# Altium footprint library 二极管封装库.PcbLib: 222 footprints (part 3 of 14)
Each footprint in its own frame and in the unit in brackets; x right, y up, seen from the top. Pads: shape width x height; smd on the part's side, far side on the other; paste and mask are expansions set on the pad; w line width, h text height; cw(c..) or ccw(c..) is an arc to the next point about the centre after c.
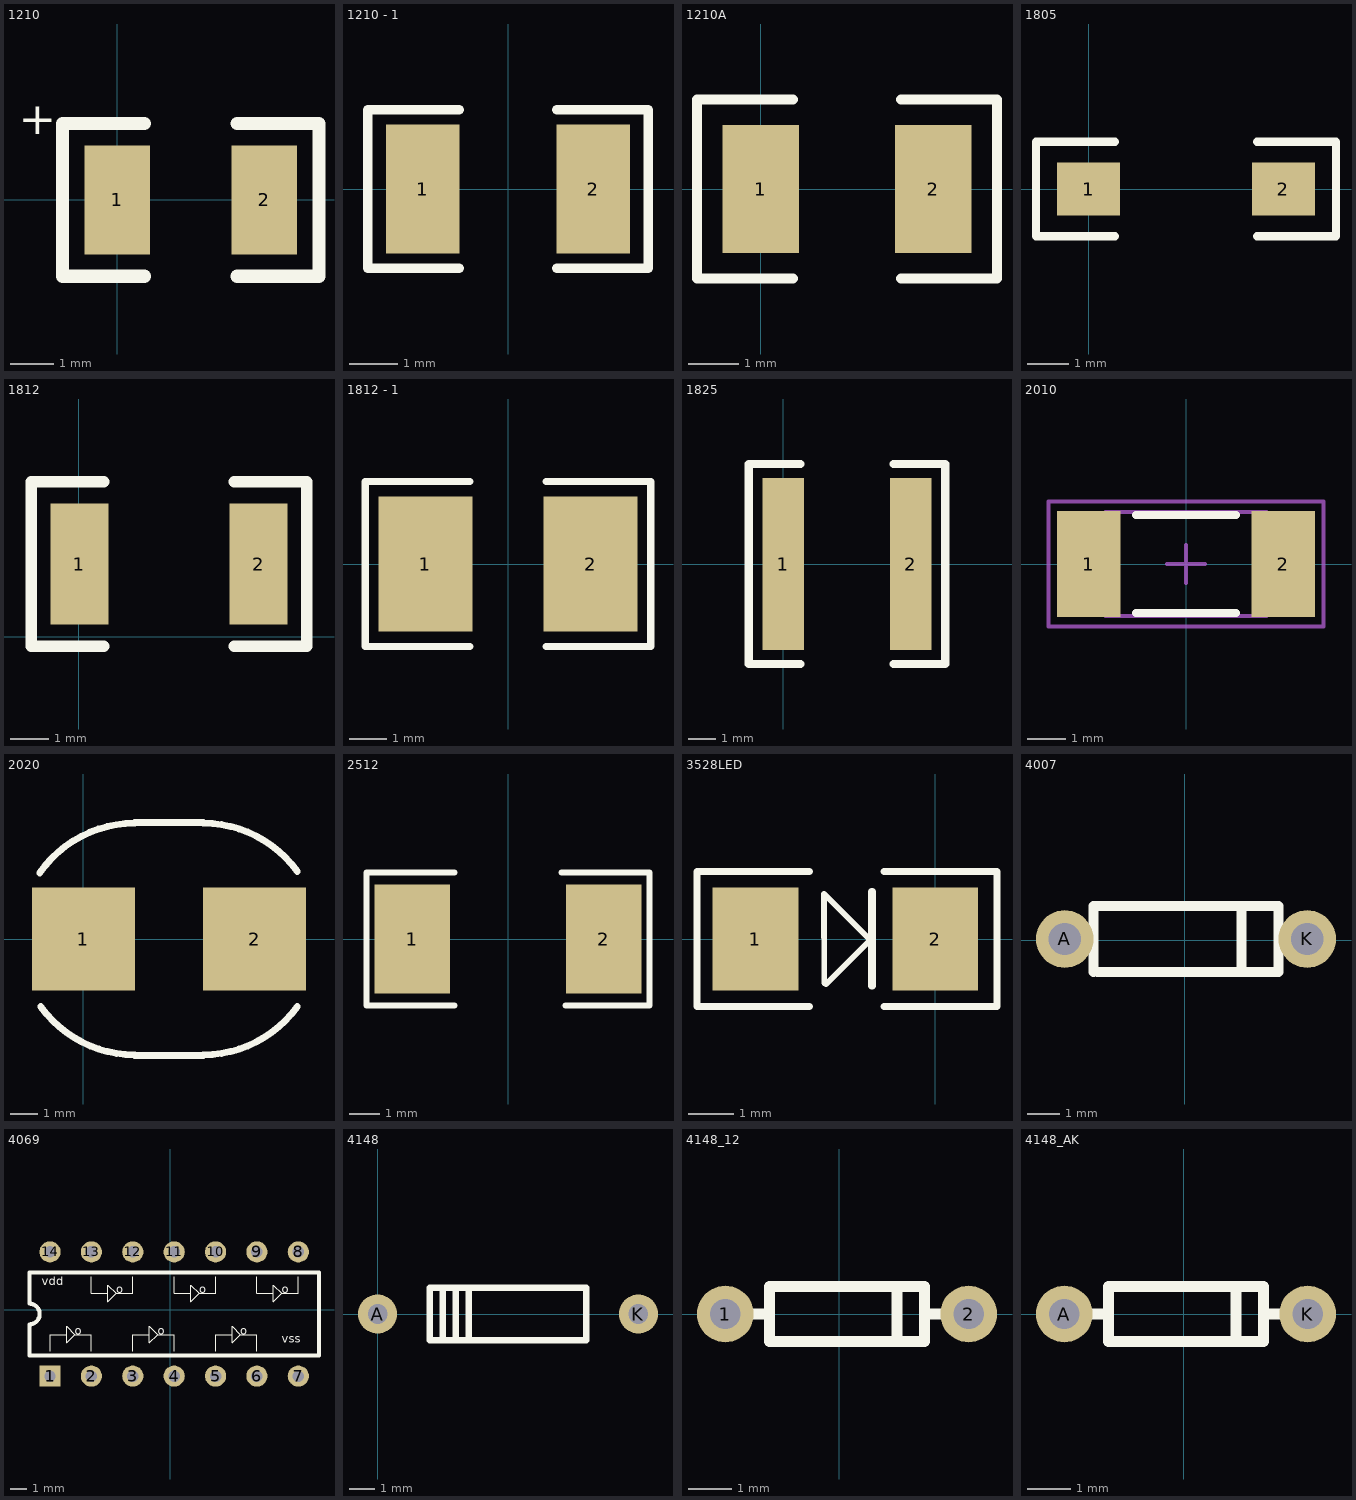
[diagram p2: the footprints below, top view; thin cyan lines are the x and y axes]

## 1210 [mil]
pads (2):
  rect 60x100 smd: 1(0,0) 2(135,0)
Top Overlay:
  lines w12: 25,-70 -50,-70 -50,70 25,70 ; 110,-70 185,-70 185,70 110,70
  text "+" at -90,60 h30

## 1210 - 1 [mil] "贴片元件"
height 59.06
pads (2):
  rect 60x106.3 smd: 1(-70,0) 2(70,0)
Top Overlay:
  lines w7.87: -40,-65 -115,-65 -115,65 -40,65 ; 40,-65 115,-65 115,65 40,65
3D body: height 39.37, standoff 0, extent -65,-50 65,50

## 1210A [mil]
pads (2):
  rect 60x100 smd: 1(0,0) 2(135,0)
Top Overlay:
  lines w7.87: 25,-70 -50,-70 -50,70 25,70 ; 110,-70 185,-70 185,70 110,70

## 1805 [mil]
pads (2):
  rect 60x50 smd: 1(0,0) 2(185,0)
Top Overlay:
  lines w7.87: 25,-45 -50,-45 -50,45 25,45 ; 160,-45 235,-45 235,45 160,45

## 1812 [mil]
pads (2):
  rect 60x125 smd: 1(1,75) 2(186,75)
Top Overlay:
  lines w12: 26,-10 -49,-10 -49,160 26,160 ; 161,-10 236,-10 236,160 161,160

## 1812 - 1 [mm] "保险丝"
height 1
pads (2):
  rect 2.5x3.6 smd: 1(-2.2,0) 2(2.2,0)
Top Overlay:
  lines w0.2: -1.016,-2.2 -3.81,-2.2 -3.81,2.2 -1.016,2.2 ; 1.016,-2.2 3.81,-2.2 3.81,2.2 1.016,2.2
3D body: height 0.9, standoff 0, extent -2.54,0.635 -2.032,1.524
3D body: height 0.9, standoff 0, extent -2.54,-1.524 -2.032,-0.635
3D body: height 0.9, standoff 0, extent 2.159,-1.524 2.667,-0.635
3D body: height 0.9, standoff 0, extent 2.159,0.635 2.667,1.524
3D body: height 1.2, standoff 0, extent -2.286,-1.651 2.286,1.651

## 1825 [mil]
pads (2):
  rect 60x250 smd: 1(0,0) 2(185,0)
Top Overlay:
  lines w12: 25,-145 -50,-145 -50,145 25,145 ; 160,-145 235,-145 235,145 160,145

## 2010 [mm] "贴片电阻"
height 0.6
pads (2):
  rect 1.65x2.75 smd: 1(-2.525,0) 2(2.525,0)
Top Overlay:
  lines w0.2: -1.3,-1.275 1.3,-1.275 ; -1.3,1.275 1.3,1.275
Mechanical 13:
  lines w0.1: -2.1,-1.35 2.1,-1.35 2.1,1.35 -2.1,1.35 -2.1,-1.35
Mechanical 15:
  lines w0.1: -0.5,0 0.5,0 ; 0,-0.5 0,0.5 ; -3.575,-1.625 3.575,-1.625 3.575,1.625 -3.575,1.625 -3.575,-1.625
3D body: height 0.6, standoff 0, extent -2.1,-1.35 2.1,1.35

## 2020 [mil]
pads (2):
  rect 150x150 smd: 1(0,0) 2(250,0)
Top Overlay:
  lines w10: -63.89,96.62 cw(c75,0) 75,169.19 ; -62.3,-98.86 ccw(c75,0) 75,-169.19 ; 75,-170 175,-170 ; 75,170 175,170 ; 175,-169.19 ccw(c175,0) 312.3,-98.86 ; 175,169.19 cw(c175,0) 312.3,98.86

## 2512 [mm] "保险丝"
height 1
pads (2):
  rect 2.5x3.6 smd: 1(-3.175,0) 2(3.175,0)
Top Overlay:
  lines w0.2: -1.778,-2.2 -4.699,-2.2 -4.699,2.2 -1.778,2.2 ; 1.778,2.2 4.699,2.2 4.699,-2.2 1.905,-2.2
3D body: height 1.2, standoff 0, extent -3.175,-1.651 3.175,1.651
3D body: height 0.9, standoff 0, extent 2.159,0.635 2.667,1.524
3D body: height 0.9, standoff 0, extent 2.159,-1.524 2.667,-0.635
3D body: height 0.9, standoff 0, extent -2.54,-1.524 -2.032,-0.635
3D body: height 0.9, standoff 0, extent -2.54,0.635 -2.032,1.524

## 3528LED [mil]
pads (2):
  rect 75x90 smd: 1(-157.48,0) 2(0,0)
Top Overlay:
  lines w5: -97.64,39.05 -96.89,39.05 -56.97,-0.87 -95.75,-39.65 ; -97.4,39.33 -97.24,-38.5
  lines w5.91: -110.24,-59.05 -208.66,-59.05 -208.66,59.05 -110.24,59.05 ; -45,-59.05 53.98,-59.05 53.98,59.05 -45,59.05
  lines w6.69: -55.51,-40.94 -55.51,41.42

## 4007 [mil]
pads (2):
  round 70 hole 39.37: A(-145.75,1.42) K(149.25,1.42)
Top Overlay:
  lines w12: -110.75,-38.58 -110.75,41.42 114.25,41.42 114.25,-38.58 -105.75,-38.58 ; 69.25,-38.58 69.25,41.42

## 4069 [mm]
pads (14):
  rect 1.3x1.3 hole 0.7: 1(-7.366,-4.064)
  round 1.3 hole 0.7: 2(-4.826,-4.064) 3(-2.286,-4.064) 4(0.254,-4.064) 5(2.794,-4.064) 6(5.334,-4.064) 7(7.874,-4.064) 8(7.874,3.556) 9(5.334,3.556) 10(2.794,3.556) 11(0.254,3.556) 12(-2.286,3.556) 13(-4.826,3.556) 14(-7.366,3.556)
Top Overlay:
  lines w0.051: -7.366,-2.54 -7.366,-1.524 -6.858,-1.524 -6.35,-1.524 ; -4.826,-2.54 -4.826,-1.524 -5.842,-1.524 ; -4.826,2.032 -4.826,1.016 -4.318,1.016 -3.81,1.016 ; -2.286,-2.54 -2.286,-1.524 -1.778,-1.524 -1.27,-1.524 ; -2.286,2.032 -2.286,1.016 -3.302,1.016 ; 0.254,-2.54 0.254,-1.524 -0.762,-1.524 ; 0.254,2.032 0.254,1.016 0.762,1.016 1.27,1.016 ; 2.794,-2.54 2.794,-1.524 3.302,-1.524 3.81,-1.524 ; 2.794,2.032 2.794,1.016 1.778,1.016 ; 5.334,-2.54 5.334,-1.524 4.318,-1.524 ; 5.334,2.032 5.334,1.016 5.842,1.016 6.35,1.016 ; 7.874,2.032 7.874,1.016 6.858,1.016 ; -5.842,-1.524 -6.35,-1.016 -6.35,-2.032 -5.842,-1.524 ; -3.302,1.016 -3.81,1.524 -3.81,0.508 -3.302,1.016 ; -0.762,-1.524 -1.27,-1.016 -1.27,-2.032 -0.762,-1.524 ; 1.778,1.016 1.27,1.524 1.27,0.508 1.778,1.016 ; 4.318,-1.524 3.81,-1.016 3.81,-2.032 4.318,-1.524 ; 6.858,1.016 6.35,1.524 6.35,0.508 6.858,1.016
  lines w0.254: -8.636,-2.794 -8.636,-0.889 ccw(c-8.636,-0.254) -8.636,0.381 -8.636,2.286 9.144,2.286 9.144,-2.794 -8.636,-2.794
  text "o" at -5.842,-1.524 h0.51
  text "o" at -0.762,-1.524 h0.51
  text "o" at 4.318,-1.524 h0.51
  text "o" at 6.858,1.016 h0.51
  text "o" at 1.778,1.016 h0.51
  text "o" at -3.302,1.016 h0.51
  text "vdd" at -7.874,1.524 h0.51
  text "vss" at 6.858,-2.032 h0.51

## 4148 [mil]
pads (2):
  round 60 hole 30: A(0,0) K(400,0)
Top Overlay:
  lines w10: 100,-40 100,40 ; 120,-40 120,40 ; 140,-40 140,40 ; 80,-40 320,-40 320,40 80,40 80,-40

## 4148_12 [mm]
pads (2):
  round 1.3 hole 0.7: 1(-2.619,0) 2(2.969,0)
Top Overlay:
  lines w0.254: -1.984,0 -1.603,0 ; 1.318,0.508 1.318,-0.635 1.318,0.635 ; 1.953,0 2.461,0 ; -1.603,-0.635 1.953,-0.635 1.953,0.635 -1.603,0.635 -1.603,-0.635

## 4148_AK [mm]
pads (2):
  round 1.3 hole 0.7: A(-2.746,0) K(2.842,0)
Top Overlay:
  lines w0.254: -2.111,0 -1.73,0 ; 1.191,0.508 1.191,-0.635 1.191,0.635 ; 1.826,0 2.334,0 ; -1.73,-0.635 -1.73,0.635 1.826,0.635 1.826,-0.635 -1.73,-0.635